# Altium footprint library WR-TBL_Pluggable PCB Header.PcbLib: 719 footprints (part 39 of 45)
Each footprint in its own frame and in the unit in brackets; x right, y up, seen from the top. Pads: shape width x height; smd on the part's side, far side on the other; paste and mask are expansions set on the pad; w line width, h text height; cw(c..) or ccw(c..) is an arc to the next point about the centre after c.
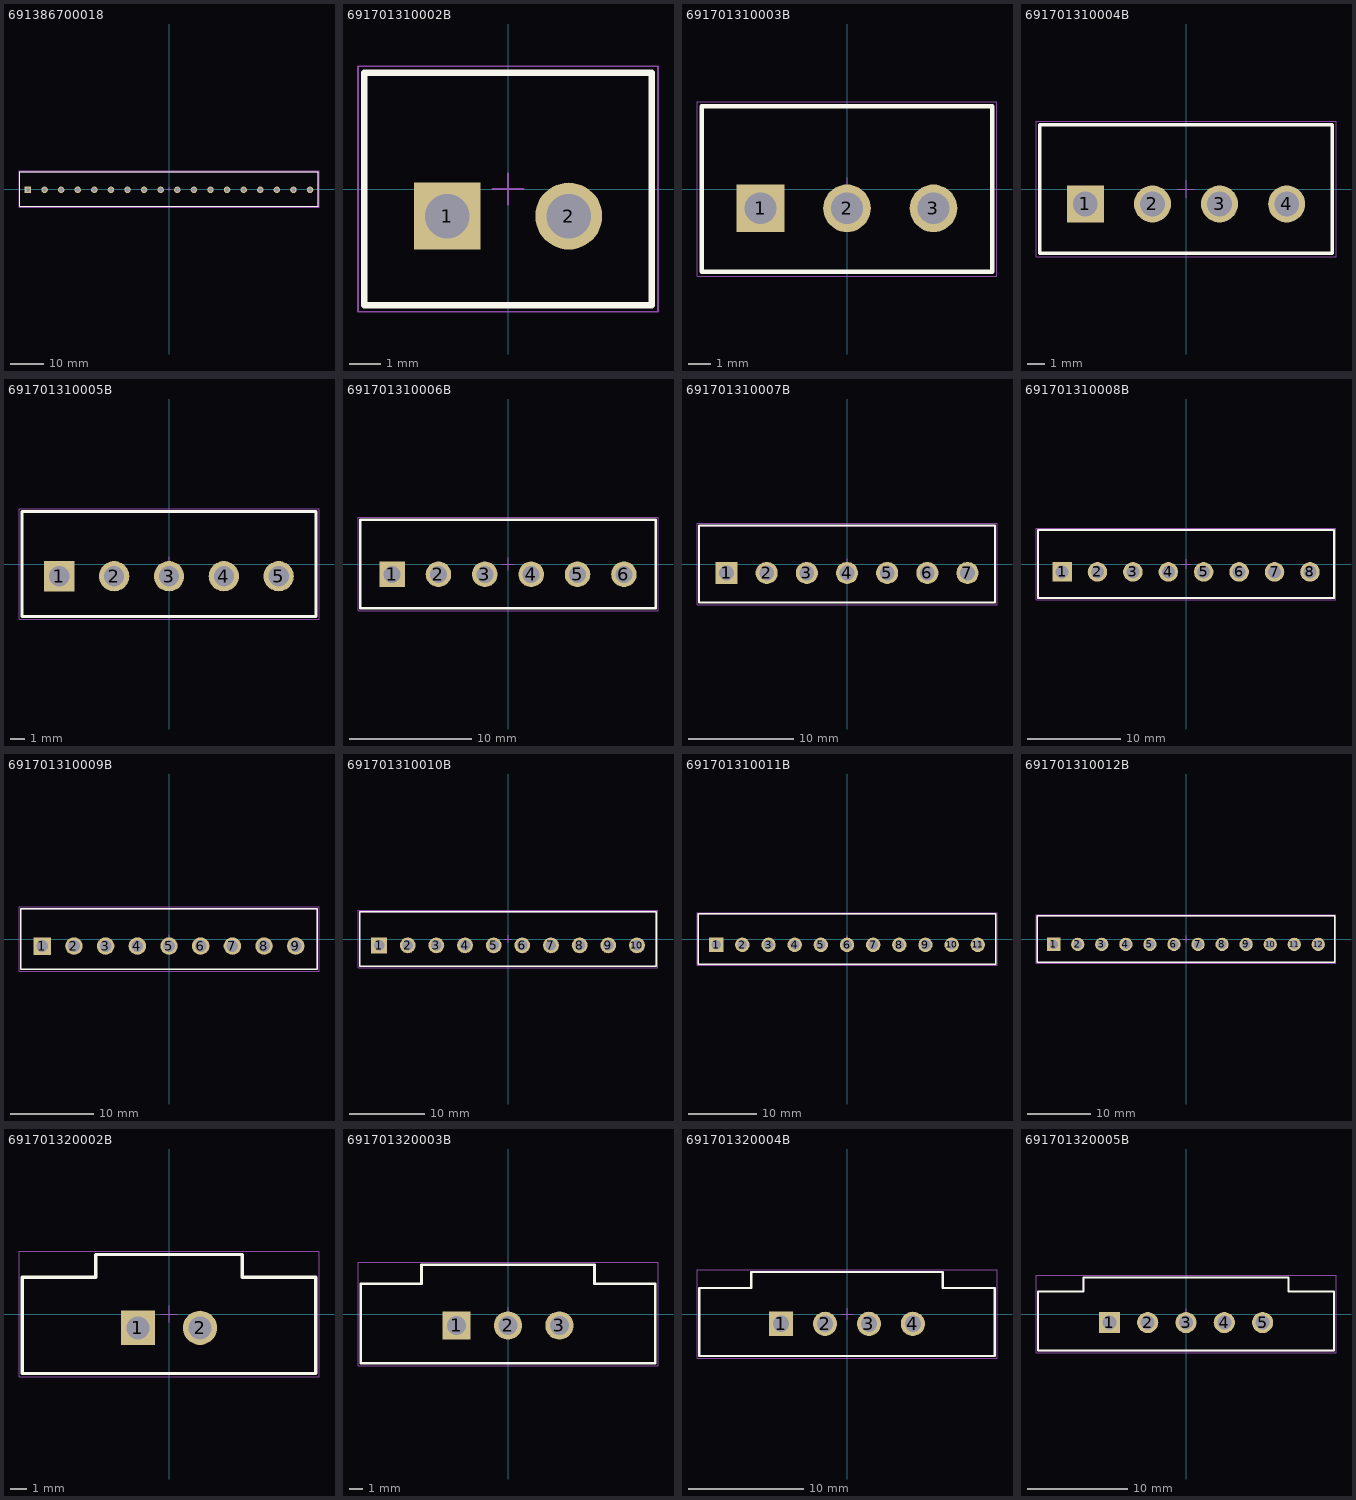
[diagram p38: the footprints below, top view; thin cyan lines are the x and y axes]

## 691386700018 [mm] "5.00mm - PCB Header ( Horizontal / Vertical ), 18p"
height 10.9
pads (18):
  rect 1.95x1.95 hole 1.3: 1(-42.5,-0.25)
  round 1.95 hole 1.3: 2(-37.5,-0.25) 3(-32.5,-0.25) 4(-27.5,-0.25) 5(-22.5,-0.25) 6(-17.5,-0.25) 7(-12.5,-0.25) 8(-7.5,-0.25) 9(-2.5,-0.25) 10(2.5,-0.25) 11(7.5,-0.25) 12(12.5,-0.25) 13(17.5,-0.25) 14(22.5,-0.25) 15(27.5,-0.25) 16(32.5,-0.25) 17(37.5,-0.25) 18(42.5,-0.25)
Top Overlay:
  lines w0.2: -45,-5.25 45,-5.25 45,5.25 -45,5.25 -45,-5.25
Mechanical 13:
  lines w0.1: -45,-5.25 -45,5.25 45,5.25 45,-5.25 -45,-5.25
Mechanical 15:
  lines w0.05: -0.5,0 0.5,0 ; 0,-0.5 0,0.5 ; -45.2,-5.45 -45.2,5.45 45.2,5.45 45.2,-5.45 -45.2,-5.45
3D body "691386700018.stp": height 11, standoff -4, extent -45,-5.25 45,5.25

## 691701310002B [mm] "Vertical PCB Header THR Type, pitch 3.81mm, 02p"
height 9.2
pads (2):
  rect 2.1x2.1 hole 1.4: 1(-1.905,-0.85)
  round 2.1 hole 1.4: 2(1.905,-0.85)
Top Overlay:
  lines w0.2: -4.505,-3.65 4.505,-3.65 4.505,3.65 -4.505,3.65 -4.505,-3.65
Mechanical 13:
  lines w0.1: -4.505,-3.65 -4.505,3.65 4.505,3.65 4.505,-3.65 -4.505,-3.65
Mechanical 15:
  lines w0.05: -0.5,0 0.5,0 ; 0,-0.5 0,0.5 ; -4.705,-3.85 4.705,-3.85 4.705,3.85 -4.705,3.85 -4.705,-3.85
3D body "691701310002B.stp": height 9.25, standoff -2.55, extent -4.505,-3.65 4.505,3.65

## 691701310003B [mm] "Vertical PCB Header THR Type, pitch 3.81mm, 03p"
height 9.2
pads (3):
  rect 2.1x2.1 hole 1.4: 1(-3.81,-0.85)
  round 2.1 hole 1.4: 2(0,-0.85) 3(3.81,-0.85)
Top Overlay:
  lines w0.2: -6.41,-3.65 -6.41,3.65 6.41,3.65 6.41,-3.65 -6.41,-3.65
Mechanical 13:
  lines w0.1: -6.41,-3.65 6.41,-3.65 6.41,3.65 -6.41,3.65 -6.41,-3.65
Mechanical 15:
  lines w0.05: -0.5,0 0.5,0 ; 0,-0.5 0,0.5 ; -6.61,-3.85 -6.61,3.85 6.61,3.85 6.61,-3.85 -6.61,-3.85
3D body "691701310003B.stp": height 9.25, standoff -2.55, extent -6.41,-3.65 6.41,3.65

## 691701310004B [mm] "Vertical PCB Header THR Type, pitch 3.81mm, 04p"
height 9.2
pads (4):
  rect 2.1x2.1 hole 1.4: 1(-5.715,-0.85)
  round 2.1 hole 1.4: 2(-1.905,-0.85) 3(1.905,-0.85) 4(5.715,-0.85)
Top Overlay:
  lines w0.2: -8.315,-3.65 -8.315,3.65 8.315,3.65 8.315,-3.65 -8.315,-3.65
Mechanical 13:
  lines w0.1: -8.315,-3.65 8.315,-3.65 8.315,3.65 -8.315,3.65 -8.315,-3.65
Mechanical 15:
  lines w0.05: -0.5,0 0.5,0 ; 0,-0.5 0,0.5 ; -8.515,-3.85 -8.515,3.85 8.515,3.85 8.515,-3.85 -8.515,-3.85
3D body "691701310004B.stp": height 9.25, standoff -2.55, extent -8.315,-3.65 8.315,3.65

## 691701310005B [mm] "Vertical PCB Header THR Type, pitch 3.81mm, 05p"
height 9.2
pads (5):
  rect 2.1x2.1 hole 1.4: 1(-7.62,-0.85)
  round 2.1 hole 1.4: 2(-3.81,-0.85) 3(0,-0.85) 4(3.81,-0.85) 5(7.62,-0.85)
Top Overlay:
  lines w0.2: -10.22,-3.65 10.22,-3.65 10.22,3.65 -10.22,3.65 -10.22,-3.65
Mechanical 13:
  lines w0.1: -10.22,-3.65 -10.22,3.65 10.22,3.65 10.22,-3.65 -10.22,-3.65
Mechanical 15:
  lines w0.05: -0.5,0 0.5,0 ; 0,-0.5 0,0.5 ; -10.42,-3.85 10.42,-3.85 10.42,3.85 -10.42,3.85 -10.42,-3.85
3D body "691701310005B.stp": height 9.25, standoff -2.55, extent -10.22,-3.65 10.22,3.65

## 691701310006B [mm] "Vertical PCB Header THR Type, pitch 3.81mm, 06p"
height 9.2
pads (6):
  rect 2.1x2.1 hole 1.4: 1(-9.525,-0.85)
  round 2.1 hole 1.4: 2(-5.715,-0.85) 3(-1.905,-0.85) 4(1.905,-0.85) 5(5.715,-0.85) 6(9.525,-0.85)
Top Overlay:
  lines w0.2: -12.125,-3.65 -12.125,3.65 12.125,3.65 12.125,-3.65 -12.125,-3.65
Mechanical 13:
  lines w0.1: -12.125,-3.65 12.125,-3.65 12.125,3.65 -12.125,3.65 -12.125,-3.65
Mechanical 15:
  lines w0.05: -0.5,0 0.5,0 ; 0,-0.5 0,0.5 ; -12.325,-3.85 -12.325,3.85 12.325,3.85 12.325,-3.85 -12.325,-3.85
3D body "691701310006B.stp": height 9.25, standoff -2.55, extent -12.125,-3.65 12.125,3.65

## 691701310007B [mm] "Vertical PCB Header THR Type, pitch 3.81mm, 07p"
height 9.2
pads (7):
  rect 2.1x2.1 hole 1.4: 1(-11.43,-0.85)
  round 2.1 hole 1.4: 2(-7.62,-0.85) 3(-3.81,-0.85) 4(0,-0.85) 5(3.81,-0.85) 6(7.62,-0.85) 7(11.43,-0.85)
Top Overlay:
  lines w0.2: -14.03,-3.65 14.03,-3.65 14.03,3.65 -14.03,3.65 -14.03,-3.65
Mechanical 13:
  lines w0.1: -14.03,-3.65 -14.03,3.65 14.03,3.65 14.03,-3.65 -14.03,-3.65
Mechanical 15:
  lines w0.05: -0.5,0 0.5,0 ; 0,-0.5 0,0.5 ; -14.23,-3.85 14.23,-3.85 14.23,3.85 -14.23,3.85 -14.23,-3.85
3D body "691701310007B.stp": height 9.25, standoff -2.55, extent -14.03,-3.65 14.03,3.65

## 691701310008B [mm] "Vertical PCB Header THR Type, pitch 3.81mm, 08p"
height 9.2
pads (8):
  rect 2.1x2.1 hole 1.4: 1(-13.335,-0.85)
  round 2.1 hole 1.4: 2(-9.525,-0.85) 3(-5.715,-0.85) 4(-1.905,-0.85) 5(1.905,-0.85) 6(5.715,-0.85) 7(9.525,-0.85) 8(13.335,-0.85)
Top Overlay:
  lines w0.2: -15.935,-3.65 -15.935,3.65 15.935,3.65 15.935,-3.65 -15.935,-3.65
Mechanical 13:
  lines w0.1: -15.935,-3.65 15.935,-3.65 15.935,3.65 -15.935,3.65 -15.935,-3.65
Mechanical 15:
  lines w0.05: -0.5,0 0.5,0 ; 0,-0.5 0,0.5 ; -16.135,-3.85 -16.135,3.85 16.135,3.85 16.135,-3.85 -16.135,-3.85
3D body "691701310008B.stp": height 9.25, standoff -2.55, extent -15.935,-3.65 15.935,3.65

## 691701310009B [mm] "Vertical PCB Header THR Type, pitch 3.81mm, 09p"
height 9.2
pads (9):
  rect 2.1x2.1 hole 1.4: 1(-15.24,-0.85)
  round 2.1 hole 1.4: 2(-11.43,-0.85) 3(-7.62,-0.85) 4(-3.81,-0.85) 5(0,-0.85) 6(3.81,-0.85) 7(7.62,-0.85) 8(11.43,-0.85) 9(15.24,-0.85)
Top Overlay:
  lines w0.2: -17.84,-3.65 -17.84,3.65 17.84,3.65 17.84,-3.65 -17.84,-3.65
Mechanical 13:
  lines w0.1: -17.84,-3.65 17.84,-3.65 17.84,3.65 -17.84,3.65 -17.84,-3.65
Mechanical 15:
  lines w0.05: -0.5,0 0.5,0 ; 0,-0.5 0,0.5 ; -18.04,-3.85 -18.04,3.85 18.04,3.85 18.04,-3.85 -18.04,-3.85
3D body "691701310009B.stp": height 9.25, standoff -2.55, extent -17.84,-3.65 17.84,3.65

## 691701310010B [mm] "Vertical PCB Header THR Type, pitch 3.81mm, 10p"
height 9.2
pads (10):
  rect 2.1x2.1 hole 1.4: 1(-17.145,-0.85)
  round 2.1 hole 1.4: 2(-13.335,-0.85) 3(-9.525,-0.85) 4(-5.715,-0.85) 5(-1.905,-0.85) 6(1.905,-0.85) 7(5.715,-0.85) 8(9.525,-0.85) 9(13.335,-0.85) 10(17.145,-0.85)
Top Overlay:
  lines w0.2: -19.745,-3.65 -19.745,3.65 19.745,3.65 19.745,-3.65 -19.745,-3.65
Mechanical 13:
  lines w0.1: -19.745,-3.65 19.745,-3.65 19.745,3.65 -19.745,3.65 -19.745,-3.65
Mechanical 15:
  lines w0.05: -0.5,0 0.5,0 ; 0,-0.5 0,0.5 ; -19.945,-3.85 -19.945,3.85 19.945,3.85 19.945,-3.85 -19.945,-3.85
3D body "691701310010B.stp": height 9.25, standoff -2.55, extent -19.745,-3.65 19.745,3.65

## 691701310011B [mm] "Vertical PCB Header THR Type, pitch 3.81mm, 11p"
height 9.2
pads (11):
  rect 2.1x2.1 hole 1.4: 1(-19.05,-0.85)
  round 2.1 hole 1.4: 2(-15.24,-0.85) 3(-11.43,-0.85) 4(-7.62,-0.85) 5(-3.81,-0.85) 6(0,-0.85) 7(3.81,-0.85) 8(7.62,-0.85) 9(11.43,-0.85) 10(15.24,-0.85) 11(19.05,-0.85)
Top Overlay:
  lines w0.2: -21.65,-3.65 21.65,-3.65 21.65,3.65 -21.65,3.65 -21.65,-3.65
Mechanical 13:
  lines w0.1: -21.65,-3.65 -21.65,3.65 21.65,3.65 21.65,-3.65 -21.65,-3.65
Mechanical 15:
  lines w0.05: -0.5,0 0.5,0 ; 0,-0.5 0,0.5 ; -21.85,-3.85 21.85,-3.85 21.85,3.85 -21.85,3.85 -21.85,-3.85
3D body "691701310011B.stp": height 9.25, standoff -2.55, extent -21.65,-3.65 21.65,3.65

## 691701310012B [mm] "Vertical PCB Header THR Type, pitch 3.81mm, 12p"
height 9.2
pads (12):
  rect 2.1x2.1 hole 1.4: 1(-20.955,-0.85)
  round 2.1 hole 1.4: 2(-17.145,-0.85) 3(-13.335,-0.85) 4(-9.525,-0.85) 5(-5.715,-0.85) 6(-1.905,-0.85) 7(1.905,-0.85) 8(5.715,-0.85) 9(9.525,-0.85) 10(13.335,-0.85) 11(17.145,-0.85) 12(20.955,-0.85)
Top Overlay:
  lines w0.2: -23.555,-3.65 23.555,-3.65 23.555,3.65 -23.555,3.65 -23.555,-3.65
Mechanical 13:
  lines w0.1: -23.555,-3.65 -23.555,3.65 23.555,3.65 23.555,-3.65 -23.555,-3.65
Mechanical 15:
  lines w0.05: -0.5,0 0.5,0 ; 0,-0.5 0,0.5 ; -23.755,-3.85 23.755,-3.85 23.755,3.85 -23.755,3.85 -23.755,-3.85
3D body "691701310012B.stp": height 9.25, standoff -2.55, extent -23.555,-3.65 23.555,3.65

## 691701320002B [mm] "THR - 3,81mm - PCB Vertical Flange - 02p"
height 9.2
pads (2):
  rect 2.1x2.1 hole 1.4: 1(-1.905,-0.85)
  round 2.1 hole 1.4: 2(1.905,-0.85)
Top Overlay:
  lines w0.2: -9.005,-3.65 -9.005,2.25 -4.5,2.25 -4.5,3.65 4.5,3.65 4.5,2.25 9.005,2.25 9.005,-3.65 -9.005,-3.65
Mechanical 13:
  lines w0.1: -9.005,-3.65 9.005,-3.65 9.005,2.25 4.5,2.25 4.5,3.65 -4.5,3.65 -4.5,2.25 -9.005,2.25 -9.005,-3.65
Mechanical 15:
  lines w0.05: -0.5,0 0.5,0 ; 0,-0.5 0,0.5 ; -9.205,-3.85 -9.205,3.85 9.205,3.85 9.205,-3.85 -9.205,-3.85
3D body "691701320002B.stp": height 9.25, standoff -2.55, extent -9.005,-3.65 9.005,3.65

## 691701320003B [mm] "THR - 3,81mm - PCB Vertical Flange - 03p"
height 9.2
pads (3):
  rect 2.1x2.1 hole 1.4: 1(-3.81,-0.85)
  round 2.1 hole 1.4: 2(0,-0.85) 3(3.81,-0.85)
Top Overlay:
  lines w0.2: -10.91,-3.65 10.91,-3.65 10.91,2.25 6.405,2.25 6.405,3.65 -6.405,3.65 -6.405,2.25 -10.91,2.25 -10.91,-3.65
Mechanical 13:
  lines w0.1: -10.91,-3.65 -10.91,2.25 -6.405,2.25 -6.405,3.65 6.405,3.65 6.405,2.25 10.91,2.25 10.91,-3.65 -10.91,-3.65
Mechanical 15:
  lines w0.05: -0.5,0 0.5,0 ; 0,-0.5 0,0.5 ; -11.11,-3.85 11.11,-3.85 11.11,3.85 -11.11,3.85 -11.11,-3.85
3D body "691701320003B.stp": height 9.25, standoff -2.55, extent -10.91,-3.65 10.91,3.65

## 691701320004B [mm] "THR - 3,81mm - PCB Vertical Flange - 04p"
height 9.2
pads (4):
  rect 2.1x2.1 hole 1.4: 1(-5.715,-0.85)
  round 2.1 hole 1.4: 2(-1.905,-0.85) 3(1.905,-0.85) 4(5.715,-0.85)
Top Overlay:
  lines w0.2: -12.815,-3.65 12.815,-3.65 12.815,2.25 8.31,2.25 8.31,3.65 -8.31,3.65 -8.31,2.25 -12.815,2.25 -12.815,-3.65
Mechanical 13:
  lines w0.1: -12.815,-3.65 -12.815,2.25 -8.31,2.25 -8.31,3.65 8.31,3.65 8.31,2.25 12.815,2.25 12.815,-3.65 -12.815,-3.65
Mechanical 15:
  lines w0.05: -0.5,0 0.5,0 ; 0,-0.5 0,0.5 ; -13.015,-3.85 13.015,-3.85 13.015,3.85 -13.015,3.85 -13.015,-3.85
3D body "691701320004B.stp": height 9.25, standoff -2.55, extent -12.815,-3.65 12.815,3.65

## 691701320005B [mm] "THR - 3,81mm - PCB Vertical Flange - 05p"
height 9.2
pads (5):
  rect 2.1x2.1 hole 1.4: 1(-7.62,-0.85)
  round 2.1 hole 1.4: 2(-3.81,-0.85) 3(0,-0.85) 4(3.81,-0.85) 5(7.62,-0.85)
Top Overlay:
  lines w0.2: -14.72,-3.65 -14.72,2.25 -10.215,2.25 -10.215,3.65 10.215,3.65 10.215,2.25 14.72,2.25 14.72,-3.65 -14.72,-3.65
Mechanical 13:
  lines w0.1: -14.72,-3.65 14.72,-3.65 14.72,2.25 10.215,2.25 10.215,3.65 -10.215,3.65 -10.215,2.25 -14.72,2.25 -14.72,-3.65
Mechanical 15:
  lines w0.05: -0.5,0 0.5,0 ; 0,-0.5 0,0.5 ; -14.92,-3.85 -14.92,3.85 14.92,3.85 14.92,-3.85 -14.92,-3.85
3D body "691701320005B.stp": height 9.25, standoff -2.55, extent -14.72,-3.65 14.72,3.65